# Altium footprint library Integrated Chips.PcbLib: 46 footprints (part 2 of 3)
Each footprint in its own frame and in the unit in brackets; x right, y up, seen from the top. Pads: shape width x height; smd on the part's side, far side on the other; paste and mask are expansions set on the pad; w line width, h text height; cw(c..) or ccw(c..) is an arc to the next point about the centre after c.
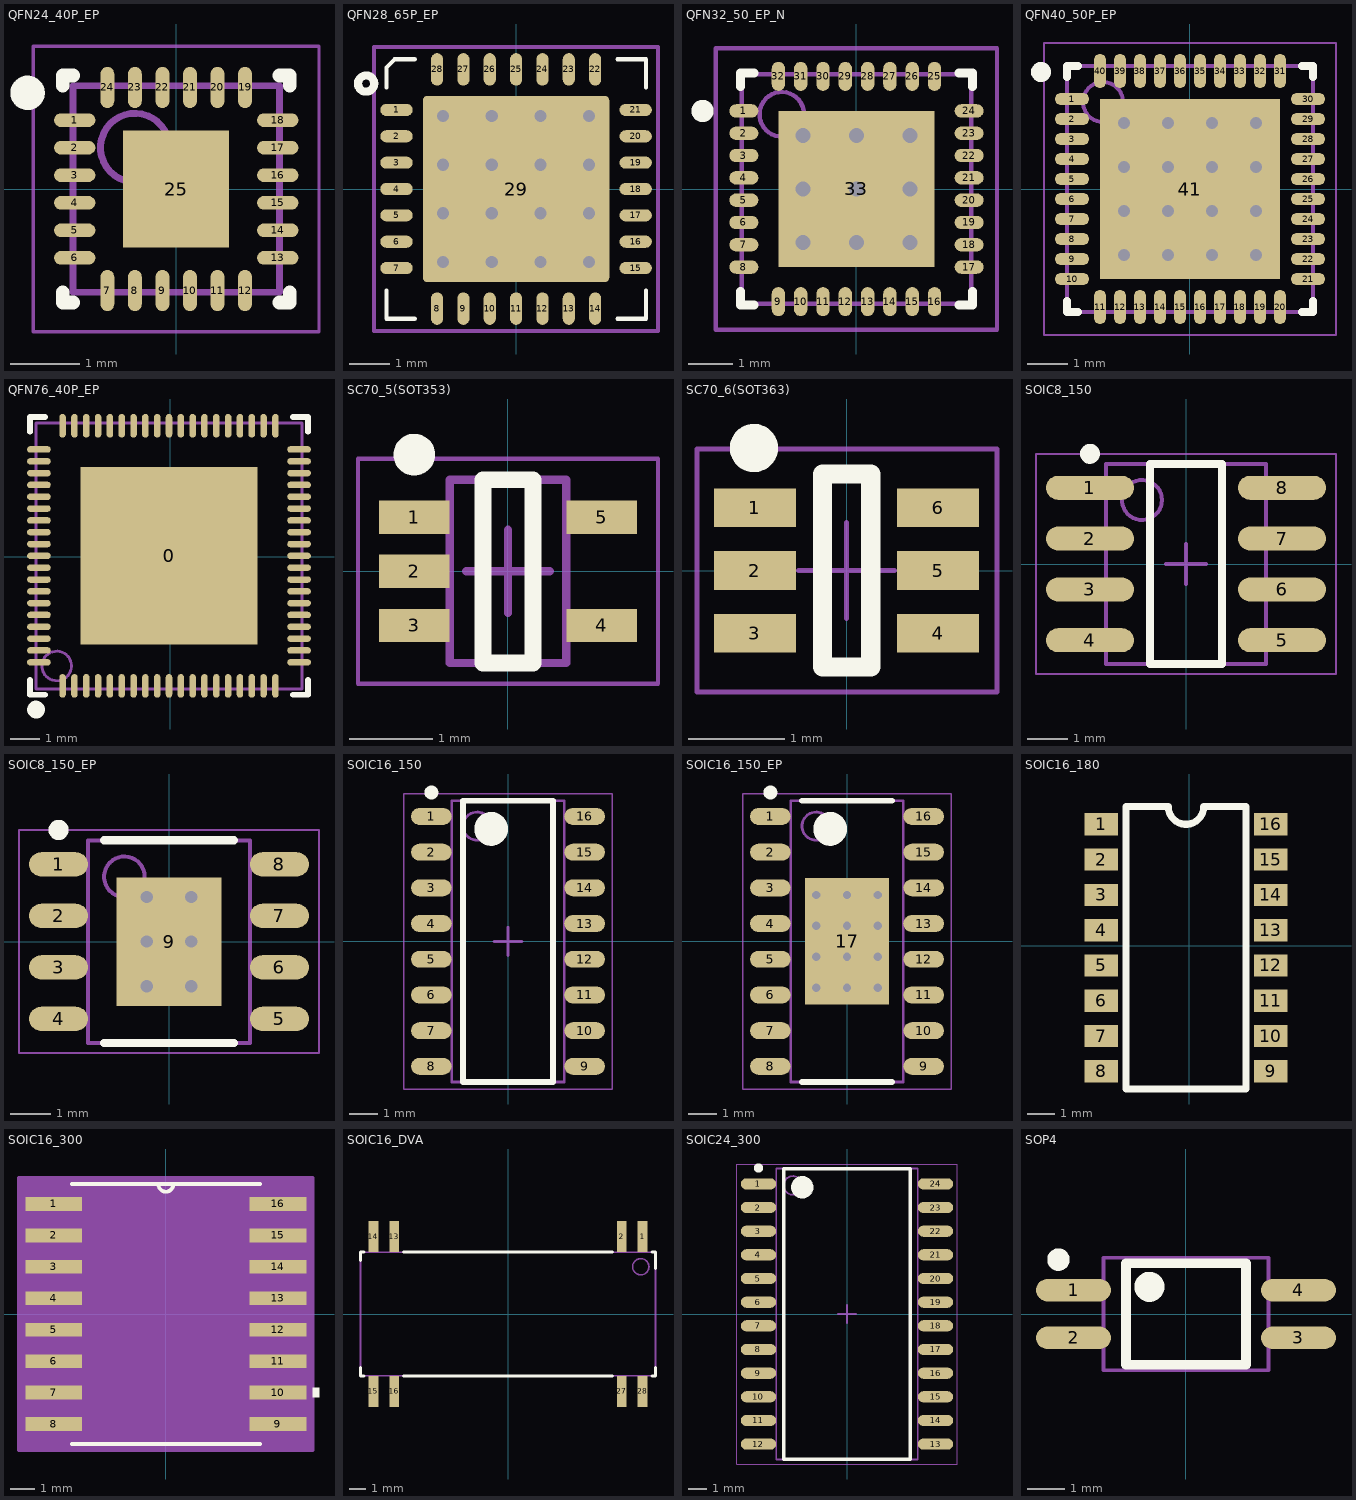
[diagram p1: the footprints below, top view; thin cyan lines are the x and y axes]

## QFN24_40P_EP [mm]
pads (25):
  oval 0.6x0.2 smd: 1(-1.475,1) 2(-1.475,0.6) 3(-1.475,0.2) 4(-1.475,-0.2) 5(-1.475,-0.6) 6(-1.475,-1) 13(1.475,-1) 14(1.475,-0.6) 15(1.475,-0.2) 16(1.475,0.2) 17(1.475,0.6) 18(1.475,1)
  oval 0.2x0.6 smd: 7(-1,-1.475) 8(-0.6,-1.475) 9(-0.2,-1.475) 10(0.2,-1.475) 11(0.6,-1.475) 12(1,-1.475) 19(1,1.475) 20(0.6,1.475) 21(0.2,1.475) 22(-0.2,1.475) 23(-0.6,1.475) 24(-1,1.475)
  rect 1.54x1.7 smd: 25(0,0)
Top Overlay:
  circle w0.25: c-2.159,1.397 r0.125
  lines w0.2: -1.65,-1.5 -1.65,-1.65 -1.5,-1.65 ; -1.65,1.5 -1.65,1.65 -1.5,1.65 ; 1.5,-1.65 1.65,-1.65 1.65,-1.5 ; 1.5,1.65 1.65,1.65 1.65,1.5
Mechanical 13:
  circle w0.1: c-0.6,0.6 r0.5
  lines w0.1: -1.5,-1.5 -1.5,1.5 1.5,1.5 1.5,-1.5 -1.5,-1.5
Mechanical 15:
  lines w0.05: -2.075,-2.075 -2.075,2.075 2.075,2.075 2.075,-2.075 -2.075,-2.075
  lines w0.1: -0.5,0 0.5,0 ; 0,-0.5 0,0.5
3D body "QFN-24 3x3 0.4mm.stp": height 1, standoff -0.05, extent -1.501,-1.501 1.501,1.501

## QFN28_65P_EP [mm]
pads (29):
  oval 0.8x0.3 smd mask+0.05: 1(-2.95,1.95) 2(-2.95,1.3) 3(-2.95,0.65) 4(-2.95,0) 5(-2.95,-0.65) 6(-2.95,-1.3) 7(-2.95,-1.95) 15(2.95,-1.95) 16(2.95,-1.3) 17(2.95,-0.65) 18(2.95,0) 19(2.95,0.65) 20(2.95,1.3) 21(2.95,1.95)
  oval 0.3x0.8 smd mask+0.05: 8(-1.95,-2.95) 9(-1.3,-2.95) 10(-0.65,-2.95) 11(0,-2.95) 12(0.65,-2.95) 13(1.3,-2.95) 14(1.95,-2.95) 22(1.95,2.95) 23(1.3,2.95) 24(0.65,2.95) 25(0,2.95) 26(-0.65,2.95) 27(-1.3,2.95) 28(-1.95,2.95)
  rrect5% 4.6x4.6 smd paste-3.3 mask+0.05: 29(0,0)
via 0.6,-1.8 diameter 0.6 hole 0.3
via 1.8,-0.6 diameter 0.6 hole 0.3
via -1.8,1.8 diameter 0.6 hole 0.3
via -1.8,-0.6 diameter 0.6 hole 0.3
via -1.8,0.6 diameter 0.6 hole 0.3
via 0.6,-0.6 diameter 0.6 hole 0.3
via 1.8,-1.8 diameter 0.6 hole 0.3
via -0.6,-1.8 diameter 0.6 hole 0.3
via -1.8,-1.8 diameter 0.6 hole 0.3
via -0.6,1.8 diameter 0.6 hole 0.3
via -0.6,0.6 diameter 0.6 hole 0.3
via -0.6,-0.6 diameter 0.6 hole 0.3
via 0.6,0.6 diameter 0.6 hole 0.3
via 0.6,1.8 diameter 0.6 hole 0.3
via 1.8,1.8 diameter 0.6 hole 0.3
via 1.8,0.6 diameter 0.6 hole 0.3
Top Overlay:
  circle w0.2: c-3.7,2.6 r0.2
  lines w0.1: -3.2,-2.5 -3.2,-3.2 -2.5,-3.2 ; -3.2,2.5 -3.2,3 -3,3.2 -2.5,3.2 ; 2.5,-3.2 3.2,-3.2 3.2,-2.5 ; 2.5,3.2 3.2,3.2 3.2,2.5
Top Paste:
  region: -1.6,-0.8 -1.6,-1.6 -0.8,-1.6 -0.8,-0.8
  region: 0.8,-0.8 0.8,-1.6 1.6,-1.6 1.6,-0.8
  region: -0.4,-0.8 -0.4,-1.6 0.4,-1.6 0.4,-0.8
  region: 0.8,0.4 0.8,-0.4 1.6,-0.4 1.6,0.4
  region: -1.6,1.6 -1.6,0.8 -0.8,0.8 -0.8,1.6
  region: -0.4,1.6 -0.4,0.8 0.4,0.8 0.4,1.6
  region: -1.6,0.4 -1.6,-0.4 -0.8,-0.4 -0.8,0.4
  region: -0.4,0.4 -0.4,-0.4 0.4,-0.4 0.4,0.4
  region: 0.8,1.6 0.8,0.8 1.6,0.8 1.6,1.6
Mechanical 15:
  lines w0.1: -3.5,-3.5 -3.5,3.5 3.5,3.5 3.5,-3.5 -3.5,-3.5
3D body: height 1, standoff 0.05, extent -3,-3 3,3

## QFN32_50_EP_N [mm] "QFN, 32-Leads, Body 5x5mm, Pitch 0.5mm, IPC Medium Density"
pads (33):
  oval 0.65x0.3 smd: 1(-2.525,1.75) 2(-2.525,1.25) 3(-2.525,0.75) 4(-2.525,0.25) 5(-2.525,-0.25) 6(-2.525,-0.75) 7(-2.525,-1.25) 8(-2.525,-1.75) 17(2.525,-1.75) 18(2.525,-1.25) 19(2.525,-0.75) 20(2.525,-0.25) 21(2.525,0.25) 22(2.525,0.75) 23(2.525,1.25) 24(2.525,1.75)
  oval 0.3x0.65 smd: 9(-1.75,-2.525) 10(-1.25,-2.525) 11(-0.75,-2.525) 12(-0.25,-2.525) 13(0.25,-2.525) 14(0.75,-2.525) 15(1.25,-2.525) 16(1.75,-2.525) 25(1.75,2.525) 26(1.25,2.525) 27(0.75,2.525) 28(0.25,2.525) 29(-0.25,2.525) 30(-0.75,2.525) 31(-1.25,2.525) 32(-1.75,2.525)
  rect 3.5x3.5 smd: 33(0,0)
via -1.2,1.2 diameter 0.66 hole 0.33
via 0,1.2 diameter 0.66 hole 0.33
via 1.2,1.2 diameter 0.66 hole 0.33
via -1.2,0 diameter 0.66 hole 0.33
via 0,0 diameter 0.66 hole 0.33
via 1.2,0 diameter 0.66 hole 0.33
via -1.2,-1.2 diameter 0.66 hole 0.33
via 0,-1.2 diameter 0.66 hole 0.33
via 1.2,-1.2 diameter 0.66 hole 0.33
Top Overlay:
  circle w0.25: c-3.45,1.75 r0.125
  lines w0.2: -2.6,-2.3 -2.6,-2.6 -2.3,-2.6 ; -2.6,2.3 -2.6,2.6 -2.3,2.6 ; 2.3,-2.6 2.6,-2.6 2.6,-2.3 ; 2.3,2.6 2.6,2.6 2.6,2.3
Mechanical 13:
  circle w0.1: c-1.675,1.675 r0.5
  lines w0.1: -2.575,-2.575 -2.575,2.575 2.575,2.575 2.575,-2.575 -2.575,-2.575
Mechanical 15:
  lines w0.1: -0.5,0 0.5,0 ; 0,-0.5 0,0.5 ; -3.15,-3.15 -3.15,3.15 3.15,3.15 3.15,-3.15 -3.15,-3.15
3D body "User Library-qfn32-5x5__ _________.STEP": height 0.8, standoff 0, extent -2.52,-2.51 2.5,2.51

## QFN40_50P_EP [mm] "PQFN, 40-Leads, Body 6.00x6.00mm, Pitch 0.50mm, Thermal Pad 4.50x4.50mm, IPC Medium Density"
height 1
pads (41):
  oval 0.85x0.3 smd: 1(-2.95,2.25) 2(-2.95,1.75) 3(-2.95,1.25) 4(-2.95,0.75) 5(-2.95,0.25) 6(-2.95,-0.25) 7(-2.95,-0.75) 8(-2.95,-1.25) 9(-2.95,-1.75) 10(-2.95,-2.25) 21(2.95,-2.25) 22(2.95,-1.75) 23(2.95,-1.25) 24(2.95,-0.75) 25(2.95,-0.25) 26(2.95,0.25) 27(2.95,0.75) 28(2.95,1.25) 29(2.95,1.75) 30(2.95,2.25)
  oval 0.3x0.85 smd: 11(-2.25,-2.95) 12(-1.75,-2.95) 13(-1.25,-2.95) 14(-0.75,-2.95) 15(-0.25,-2.95) 16(0.25,-2.95) 17(0.75,-2.95) 18(1.25,-2.95) 19(1.75,-2.95) 20(2.25,-2.95) 31(2.25,2.95) 32(1.75,2.95) 33(1.25,2.95) 34(0.75,2.95) 35(0.25,2.95) 36(-0.25,2.95) 37(-0.75,2.95) 38(-1.25,2.95) 39(-1.75,2.95) 40(-2.25,2.95)
  rect 4.5x4.5 smd: 41(0,0)
via 1.65,-1.65 diameter 0.5 hole 0.3
via 0.55,-1.65 diameter 0.5 hole 0.3
via -0.55,-1.65 diameter 0.5 hole 0.3
via -1.65,-1.65 diameter 0.5 hole 0.3
via 1.65,-0.55 diameter 0.5 hole 0.3
via 0.55,-0.55 diameter 0.5 hole 0.3
via -0.55,-0.55 diameter 0.5 hole 0.3
via -1.65,-0.55 diameter 0.5 hole 0.3
via 1.65,0.55 diameter 0.5 hole 0.3
via 0.55,0.55 diameter 0.5 hole 0.3
via -0.55,0.55 diameter 0.5 hole 0.3
via -1.65,0.55 diameter 0.5 hole 0.3
via 1.65,1.65 diameter 0.5 hole 0.3
via 0.55,1.65 diameter 0.5 hole 0.3
via -0.55,1.65 diameter 0.5 hole 0.3
via -1.65,1.65 diameter 0.5 hole 0.3
Top Overlay:
  circle w0.25: c-3.725,2.925 r0.125
  lines w0.2: -3.075,-2.8 -3.075,-3.075 -2.8,-3.075 ; -3.075,2.8 -3.075,3.075 -2.8,3.075 ; 2.8,-3.075 3.075,-3.075 3.075,-2.8 ; 2.8,3.075 3.075,3.075 3.075,2.8
Mechanical 13:
  circle w0.1: c-2.175,2.175 r0.5
  lines w0.1: -3.075,-3.075 3.075,-3.075 3.075,3.075 -3.075,3.075 -3.075,-3.075
Mechanical 15:
  lines w0.05: -3.65,-3.65 3.65,-3.65 3.65,3.65 -3.65,3.65 -3.65,-3.65
  lines w0.1: -0.5,0 0.5,0 ; 0,-0.5 0,0.5
3D body "User Library-QFN40-1.step": height 0.9, standoff 0, extent -3,-3 3,3

## QFN76_40P_EP [mm]
height 0.85
pads (77):
  rect 6x6 smd mask+0.051: 0(-0.05,0.025)
  oval 0.22x0.8 smd mask+0.051: 1(-3.65,-4.375) 2(-3.25,-4.375) 3(-2.85,-4.375) 4(-2.45,-4.375) 5(-2.05,-4.375) 6(-1.65,-4.375) 7(-1.25,-4.375) 8(-0.85,-4.375) 9(-0.45,-4.375) 10(-0.05,-4.375) 11(0.35,-4.375) 12(0.75,-4.375) 13(1.15,-4.375) 14(1.55,-4.375) 15(1.95,-4.375) 16(2.35,-4.375) 17(2.75,-4.375) 18(3.15,-4.375) 19(3.55,-4.375) 39(3.55,4.425) 40(3.15,4.425) 41(2.75,4.425) 42(2.35,4.425) 43(1.95,4.425) 44(1.55,4.425) 45(1.15,4.425) 46(0.75,4.425) 47(0.35,4.425) 48(-0.05,4.425) 49(-0.45,4.425) 50(-0.85,4.425) 51(-1.25,4.425) 52(-1.65,4.425) 53(-2.05,4.425) 54(-2.45,4.425) 55(-2.85,4.425) 56(-3.25,4.425) 57(-3.65,4.425)
  oval 0.8x0.22 smd mask+0.051: 20(4.35,-3.575) 21(4.35,-3.175) 22(4.35,-2.775) 23(4.35,-2.375) 24(4.35,-1.975) 25(4.35,-1.575) 26(4.35,-1.175) 27(4.35,-0.775) 28(4.35,-0.375) 29(4.35,0.025) 30(4.35,0.425) 31(4.35,0.825) 32(4.35,1.225) 33(4.35,1.625) 34(4.35,2.025) 35(4.35,2.425) 36(4.35,2.825) 37(4.35,3.225) 38(4.35,3.625) 58(-4.45,3.625) 59(-4.45,3.225) 60(-4.45,2.825) 61(-4.45,2.425) 62(-4.45,2.025) 63(-4.45,1.625) 64(-4.45,1.225) 65(-4.45,0.825) 66(-4.45,0.425) 67(-4.45,0.025) 68(-4.45,-0.375) 69(-4.45,-0.775) 70(-4.45,-1.175) 71(-4.45,-1.575) 72(-4.45,-1.975) 73(-4.45,-2.375) 74(-4.45,-2.775) 75(-4.45,-3.175) 76(-4.45,-3.575)
Top Overlay:
  circle w0.3: c-4.55,-5.175 r0.15
  lines w0.2: -4.75,-4.175 -4.75,-4.675 -4.25,-4.675 ; -4.75,4.225 -4.75,4.725 -4.25,4.725 ; 4.15,-4.675 4.65,-4.675 4.65,-4.175 ; 4.15,4.725 4.65,4.725 4.65,4.225
Mechanical 13:
  circle w0.1: c-3.85,-3.7 r0.5
  lines w0.1: -4.55,-4.475 -4.55,4.525 4.45,4.525 4.45,-4.475 -4.55,-4.475
3D body "QFN56 8x8.STEP": height 0.95, standoff 0, extent -4.015,-4.015 4.015,4.015

## SC70_5(SOT353) [mm] "SOT353, 5-Leads, Body 2.00x2.10mm, Pitch 0.65mm, IPC Medium Density"
height 0.8
pads (5):
  rect 0.85x0.4 smd: 1(-1.125,0.65) 2(-1.125,0) 3(-1.125,-0.65) 4(1.125,-0.65) 5(1.125,0.65)
Top Overlay:
  circle w0.25: c-1.125,1.4 r0.125
  lines w0.2: -0.3,-1.1 -0.3,1.1 0.3,1.1 0.3,-1.1 -0.3,-1.1
Mechanical 13:
  lines w0.1: -0.7,-1.1 0.7,-1.1 0.7,1.1 -0.7,1.1 -0.7,-1.1
Mechanical 15:
  lines w0.05: -1.8,-1.35 1.8,-1.35 1.8,1.35 -1.8,1.35 -1.8,-1.35
  lines w0.1: -0.5,0 0.5,0 ; 0,-0.5 0,0.5
3D body "User Library-SOT353-1.step": height 1.1, standoff 0, extent -1.2,-1.1 1.2,1.1

## SC70_6(SOT363) [mm] "6-Lead Thin Shrink Small Outline Transistor Package"
pads (6):
  rect 0.85x0.4 smd mask+0.05: 1(-0.95,0.65) 2(-0.95,0) 3(-0.95,-0.65) 4(0.95,-0.65) 5(0.95,0) 6(0.95,0.65)
Top Overlay:
  circle w0.25: c-0.96,1.27 r0.125
  lines w0.2: -0.25,-1 -0.25,1 0.25,1 0.25,-1 -0.25,-1
Mechanical 15:
  lines w0.05: -0.5,0 0.5,0 ; 0,-0.5 0,0.5 ; -1.55,-1.26 -1.55,1.26 1.56,1.26 1.56,-1.26 -1.55,-1.26
3D body "User Library-sot363.STEP": height 1, standoff 0, extent -1.15,-1.05 1.15,1.05

## SOIC8_150 [mm]
height 2
pads (8):
  oval 2.2x0.6 smd: 1(-2.4,1.905) 2(-2.4,0.635) 3(-2.4,-0.635) 4(-2.4,-1.905) 5(2.4,-1.905) 6(2.4,-0.635) 7(2.4,0.635) 8(2.4,1.905)
Top Overlay:
  circle w0.25: c-2.4,2.755 r0.125
  lines w0.2: -0.9,-2.5 -0.9,2.5 0.9,2.5 0.9,-2.5 -0.9,-2.5
Mechanical 13:
  circle w0.1: c-1.1,1.6 r0.5
  lines w0.1: -2,-2.5 -2,2.5 2,2.5 2,-2.5 -2,-2.5
Mechanical 15:
  lines w0.05: -3.75,-2.75 -3.75,2.75 3.75,2.75 3.75,-2.75 -3.75,-2.75
  lines w0.1: -0.5,0 0.5,0 ; 0,-0.5 0,0.5
3D body "SOIC8.STEP": height 1.6, standoff 0, extent -3.021,-2.51 3.021,2.51

## SOIC8_150_EP [mm] "SOIC, 8-Leads, Body 4.90x3.90mm, Pitch 1.27mm, Thermal Pad 3.17x2.43mm, IPC Medium Density"
height 1.68
pads (9):
  oval 1.45x0.6 smd: 1(-2.725,1.905) 2(-2.725,0.635) 3(-2.725,-0.635) 4(-2.725,-1.905) 5(2.725,-1.905) 6(2.725,-0.635) 7(2.725,0.635) 8(2.725,1.905)
  rect 2.6x3.17 smd: 9(0,0)
via 0.55,-1.1 diameter 0.5 hole 0.3
via -0.55,-1.1 diameter 0.5 hole 0.3
via 0.55,0 diameter 0.5 hole 0.3
via -0.55,0 diameter 0.5 hole 0.3
via 0.55,1.1 diameter 0.5 hole 0.3
via -0.55,1.1 diameter 0.5 hole 0.3
Top Overlay:
  circle w0.25: c-2.725,2.755 r0.125
  lines w0.2: -1.6,-2.5 1.6,-2.5 ; -1.6,2.5 1.6,2.5
Mechanical 13:
  circle w0.1: c-1.1,1.6 r0.5
  lines w0.1: -2,-2.5 2,-2.5 2,2.5 -2,2.5 -2,-2.5
Mechanical 15:
  lines w0.05: -3.7,-2.75 3.7,-2.75 3.7,2.75 -3.7,2.75 -3.7,-2.75
  lines w0.1: -0.5,0 0.5,0 ; 0,-0.5 0,0.5
3D body "SOIC8.STEP": height 1.6, standoff 0, extent -3.021,-2.51 3.021,2.51

## SOIC16_150 [mm] "SOP, 16-Leads, Body 9.90x3.90mm, Pitch 1.27mm, IPC Medium Density"
height 1.75
pads (16):
  oval 1.45x0.6 smd: 1(-2.725,4.445) 2(-2.725,3.175) 3(-2.725,1.905) 4(-2.725,0.635) 5(-2.725,-0.635) 6(-2.725,-1.905) 7(-2.725,-3.175) 8(-2.725,-4.445) 9(2.725,-4.445) 10(2.725,-3.175) 11(2.725,-1.905) 12(2.725,-0.635) 13(2.725,0.635) 14(2.725,1.905) 15(2.725,3.175) 16(2.725,4.445)
Top Overlay:
  circle w0.25: c-2.725,5.295 r0.125
  circle w0.6: c-0.6,4 r0.3
  lines w0.2: -1.6,-5 -1.6,5 1.6,5 1.6,-5 -1.6,-5
Mechanical 13:
  circle w0.1: c-1.1,4.1 r0.5
  lines w0.1: -2,-5 -2,5 2,5 2,-5 -2,-5
Mechanical 15:
  lines w0.05: -3.7,-5.25 -3.7,5.25 3.7,5.25 3.7,-5.25 -3.7,-5.25
  lines w0.1: -0.5,0 0.5,0 ; 0,-0.5 0,0.5
3D body "User Library-SO-16N, 9.9X3.9.STEP": height 1.62, standoff 0, extent -3,-4.965 3,4.965

## SOIC16_150_EP [mm] "SOP, 16-Leads, Body 9.90x3.90mm, Pitch 1.27mm, Thermal Pad 4.50x3.00mm, IPC Medium Density"
height 1.75
pads (17):
  oval 1.45x0.6 smd: 1(-2.725,4.445) 2(-2.725,3.175) 3(-2.725,1.905) 4(-2.725,0.635) 5(-2.725,-0.635) 6(-2.725,-1.905) 7(-2.725,-3.175) 8(-2.725,-4.445) 9(2.725,-4.445) 10(2.725,-3.175) 11(2.725,-1.905) 12(2.725,-0.635) 13(2.725,0.635) 14(2.725,1.905) 15(2.725,3.175) 16(2.725,4.445)
  rect 3x4.5 smd: 17(0,0)
via 1.1,-1.65 diameter 0.5 hole 0.3
via 0,-1.65 diameter 0.5 hole 0.3
via -1.1,-1.65 diameter 0.5 hole 0.3
via 1.1,-0.55 diameter 0.5 hole 0.3
via 0,-0.55 diameter 0.5 hole 0.3
via -1.1,-0.55 diameter 0.5 hole 0.3
via 1.1,0.55 diameter 0.5 hole 0.3
via 0,0.55 diameter 0.5 hole 0.3
via -1.1,0.55 diameter 0.5 hole 0.3
via 1.1,1.65 diameter 0.5 hole 0.3
via 0,1.65 diameter 0.5 hole 0.3
via -1.1,1.65 diameter 0.5 hole 0.3
Top Overlay:
  circle w0.6: c-0.6,4 r0.3
  circle w0.25: c-2.725,5.295 r0.125
  lines w0.2: -1.6,-5 1.6,-5 ; -1.6,5 1.6,5
Mechanical 13:
  circle w0.1: c-1.1,4.1 r0.5
  lines w0.1: -2,-5 2,-5 2,5 -2,5 -2,-5
Mechanical 15:
  lines w0.05: -3.7,-5.25 3.7,-5.25 3.7,5.25 -3.7,5.25 -3.7,-5.25
  lines w0.1: -0.5,0 0.5,0 ; 0,-0.5 0,0.5
3D body "User Library-SO-16N, 9.9X3.9.STEP": height 1.62, standoff 0, extent -3,-4.965 3,4.965

## SOIC16_180 [mm]
height 3
pads (16):
  rect 1.2x0.8 smd: 1(-3.173,4.367) 2(-3.173,3.097) 3(-3.173,1.827) 4(-3.173,0.557) 5(-3.173,-0.713) 6(-3.173,-1.983) 7(-3.173,-3.253) 8(-3.173,-4.523) 9(2.923,-4.523) 10(2.923,-3.253) 11(2.923,-1.983) 12(2.923,-0.713) 13(2.923,0.557) 14(2.923,1.827) 15(2.923,3.097) 16(2.923,4.367)
Top Overlay:
  lines w0.254: -2.286,-5.158 2.032,-5.158 2.032,5.002 0.51,5.002 cw(c-0.125,5.002) -0.76,5.002 -2.286,5.002 -2.286,-5.158
3D body "SOIC16.STEP": height 1.95, standoff 0, extent -3.155,-5.277 2.901,5.023

## SOIC16_300 [mil]
pads (16):
  rect 90.5x22 smd: 1(-178.25,175) 2(-178.25,125) 3(-178.25,75) 4(-178.25,25) 5(-178.25,-25) 6(-178.25,-75) 7(-178.25,-125) 8(-178.25,-175) 9(178.25,-175) 10(178.25,-125) 11(178.25,-75) 12(178.25,-25) 13(178.25,25) 14(178.25,75) 15(178.25,125) 16(178.25,175)
Top Overlay:
  region: 233.5,-117.5 243.5,-117.5 243.5,-132.5 233.5,-132.5
  lines w6: -149.5,-206.5 149.5,-206.5 ; -149.5,206.5 149.5,206.5 ; -12,206.5 ccw(c0,206.5) 12,206.5
Mechanical 13:
  lines w0: -12,206.5 ccw(c0,206.5) 12,206.5
Mechanical 15:
  region: 233.5,-216.5 -233.5,-216.5 -233.5,216.5 233.5,216.5
  lines w6: -233.5,-216.5 -233.5,216.5 233.5,216.5 233.5,-216.5 -233.5,-216.5
3D body "User Library-SOIC16_Wide_JEDEC_MS-013AA.SLDPRT": height 103.35, standoff -0.98, extent -209.25,-206.7 209.25,206.69

## SOIC16_DVA [mm] "ISO124U"
pads (8):
  rect 0.6x1.9 smd paste+0 mask+0.051: 1(8.255,4.75) 2(6.985,4.75) 13(-6.985,4.75) 14(-8.255,4.75) 15(-8.255,-4.75) 16(-6.985,-4.75) 27(6.985,-4.75) 28(8.255,-4.75)
Top Overlay:
  lines w0.2: -9.05,-3.3 -9.05,-3.8 -8.85,-3.8 ; -9.05,3.3 -9.05,3.8 -8.85,3.8 ; -6.4,-3.8 6.4,-3.8 ; -6.4,3.8 6.4,3.8 ; 8.85,-3.8 9.05,-3.8 9.05,-3.3 ; 8.85,3.8 9.05,3.8 9.05,2.8
Mechanical 13:
  circle w0.1: c8.15,2.9 r0.5
  lines w0.1: -9.05,-3.8 -9.05,3.8 9.05,3.8 9.05,-3.8 -9.05,-3.8
3D body "User Library-ISO_SMD_DVA.STEP": height 2.65, standoff 0, extent -9.05,-5.325 9.05,5.325

## SOIC24_300 [mm] "SOIC, 24-Leads, Body 15.40x7.50mm, Pitch 1.27mm, IPC Medium Density"
height 2.65
pads (24):
  oval 1.9x0.6 smd: 1(-4.75,6.985) 2(-4.75,5.715) 3(-4.75,4.445) 4(-4.75,3.175) 5(-4.75,1.905) 6(-4.75,0.635) 7(-4.75,-0.635) 8(-4.75,-1.905) 9(-4.75,-3.175) 10(-4.75,-4.445) 11(-4.75,-5.715) 12(-4.75,-6.985) 13(4.75,-6.985) 14(4.75,-5.715) 15(4.75,-4.445) 16(4.75,-3.175) 17(4.75,-1.905) 18(4.75,-0.635) 19(4.75,0.635) 20(4.75,1.905) 21(4.75,3.175) 22(4.75,4.445) 23(4.75,5.715) 24(4.75,6.985)
Top Overlay:
  circle w0.6: c-2.4,6.8 r0.3
  circle w0.25: c-4.75,7.835 r0.125
  lines w0.2: -3.4,-7.8 3.4,-7.8 3.4,7.8 -3.4,7.8 -3.4,-7.8
Mechanical 13:
  circle w0.1: c-2.9,6.9 r0.5
  lines w0.1: -3.8,-7.8 3.8,-7.8 3.8,7.8 -3.8,7.8 -3.8,-7.8
Mechanical 15:
  lines w0.05: -5.925,-8.05 5.925,-8.05 5.925,8.05 -5.925,8.05 -5.925,-8.05
  lines w0.1: -0.5,0 0.5,0 ; 0,-0.5 0,0.5
3D body "User Library-SO-24W, 15.4X7.5.STEP": height 2.48, standoff 0, extent -5.155,-7.705 5.155,7.705

## SOP4 [mm]
height 2
pads (4):
  oval 2x0.6 smd: 1(-3,0.635) 2(-3,-0.635) 3(3,-0.635) 4(3,0.635)
Top Overlay:
  circle w0.3: c-3.4,1.45 r0.15
  circle w0.4: c-0.975,0.725 r0.2
  lines w0.254: -1.6,-1.35 -1.6,1.35 1.6,1.35 1.6,-1.35 -1.6,-1.35
Mechanical 13:
  lines w0.1: -2.2,-1.5 -2.2,1.5 2.2,1.5 2.2,-1.5 -2.2,-1.5
3D body "SOP_4P_1.27mm.STEP": height 2.6, standoff 0, extent -3.5,-1.27 3.5,1.165